# Altium footprint library 方林 封装库.PcbLib: 101 footprints (part 3 of 7)
Each footprint in its own frame and in the unit in brackets; x right, y up, seen from the top. Pads: shape width x height; smd on the part's side, far side on the other; paste and mask are expansions set on the pad; w line width, h text height; cw(c..) or ccw(c..) is an arc to the next point about the centre after c.
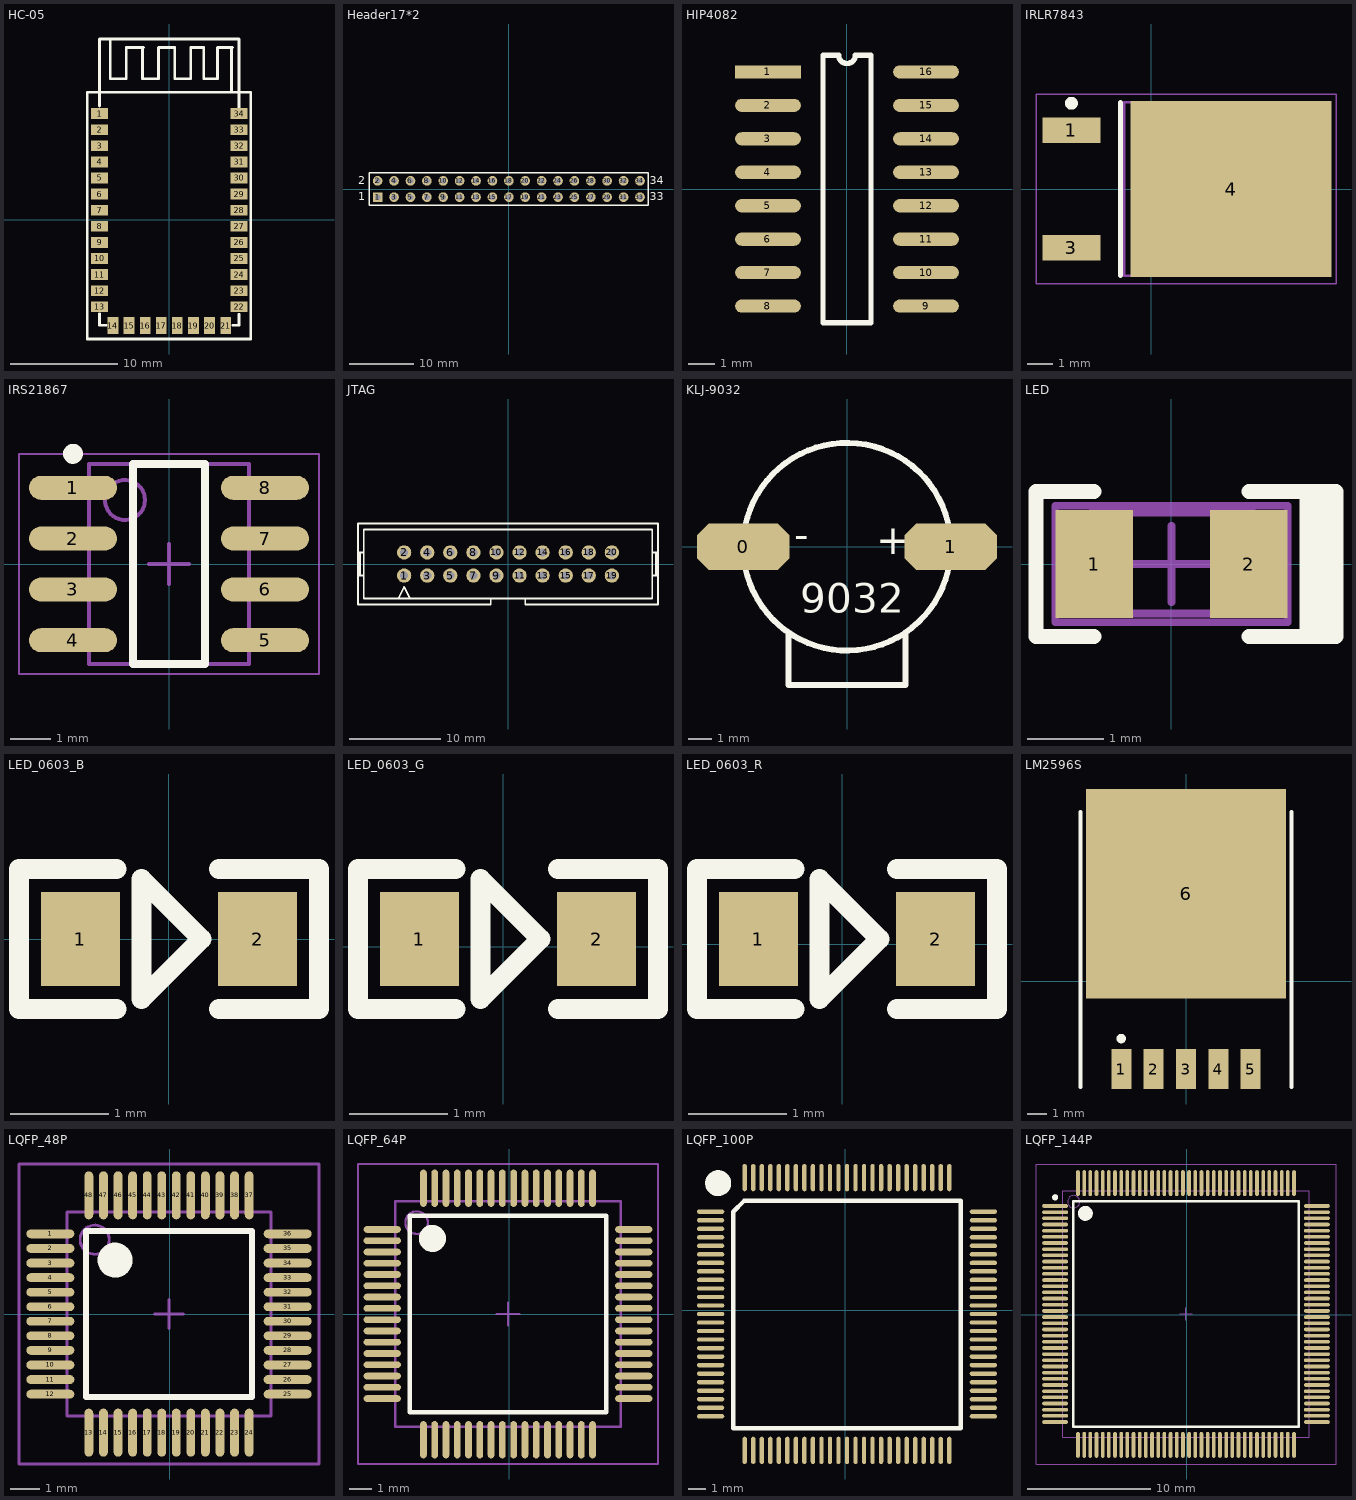
[diagram p2: the footprints below, top view; thin cyan lines are the x and y axes]

## HC-05 [mm]
pads (34):
  rect 1.6x1 smd: 1(-6.5,9.875) 2(-6.5,8.375) 3(-6.5,6.875) 4(-6.5,5.375) 5(-6.5,3.875) 6(-6.5,2.375) 7(-6.5,0.875) 8(-6.5,-0.625) 9(-6.5,-2.125) 10(-6.5,-3.625) 11(-6.5,-5.125) 12(-6.5,-6.625) 13(-6.5,-8.125) 22(6.5,-8.125) 23(6.5,-6.625) 24(6.5,-5.125) 25(6.5,-3.625) 26(6.5,-2.125) 27(6.5,-0.625) 28(6.5,0.875) 29(6.5,2.375) 30(6.5,3.875) 31(6.5,5.375) 32(6.5,6.875) 33(6.5,8.375) 34(6.5,9.875)
  rect 1x1.6 smd: 14(-5.25,-9.875) 15(-3.75,-9.875) 16(-2.25,-9.875) 17(-0.75,-9.875) 18(0.75,-9.875) 19(2.25,-9.875) 20(3.75,-9.875) 21(5.25,-9.875)
Top Overlay:
  lines w0.254: -6.5,-8.775 -6.5,-9.85 -5.875,-9.85 ; -6.5,10.575 -6.5,16.825 6.5,16.825 ; -5.5,16.725 -5.5,13.125 -4,13.125 -4,16.025 -2.4,16.025 -2.5,15.925 -2.5,13.125 -1,13.125 -1,16.025 0.5,16.025 0.5,13.125 2,13.125 2,16.025 3.2,16.025 3.2,13.125 4.5,13.125 4.5,16.025 5.9,16.025 5.8,15.925 5.8,12.025 ; 5.925,-9.85 6.5,-9.85 6.5,-8.825 ; 6.5,10.475 6.5,16.8 ; -7.65,-11.125 -7.65,11.875 -6.325,11.875 6.675,11.875 7.6,11.875 7.6,-11.125 -7.65,-11.125
3D body: height 0.05, standoff 0, extent -6.581,-9.903 6.5,16.767

## Header17*2 [mm]
pads (34):
  rect 1.5x1.5 hole 0.9: 1(-20.32,-1.27)
  round 1.5 hole 0.9: 2(-20.32,1.27) 3(-17.78,-1.27) 4(-17.78,1.27) 5(-15.24,-1.27) 6(-15.24,1.27) 7(-12.7,-1.27) 8(-12.7,1.27) 9(-10.16,-1.27) 10(-10.16,1.27) 11(-7.62,-1.27) 12(-7.62,1.27) 13(-5.08,-1.27) 14(-5.08,1.27) 15(-2.54,-1.27) 16(-2.54,1.27) 17(0,-1.27) 18(0,1.27) 19(2.54,-1.27) 20(2.54,1.27) 21(5.08,-1.27) 22(5.08,1.27) 23(7.62,-1.27) 24(7.62,1.27) 25(10.16,-1.27) 26(10.16,1.27) 27(12.7,-1.27) 28(12.7,1.27) 29(15.24,-1.27) 30(15.24,1.27) 31(17.78,-1.27) 32(17.78,1.27) 33(20.32,-1.27) 34(20.32,1.27)
Top Overlay:
  lines w0.2: -21.59,-2.54 21.59,-2.54 21.59,2.54 -21.59,2.54 -21.59,-2.54
  text "34" at 21.844,0.762 h1.27
  text "33" at 21.844,-1.778 h1.27
  text "1" at -23.368,-1.778 h1.27
  text "2" at -23.368,0.762 h1.27

## HIP4082 [mm]
pads (16):
  rect 2.5x0.5 smd: 1(-3,4.445)
  oval 2.5x0.5 smd: 2(-3,3.175) 3(-3,1.905) 4(-3,0.635) 5(-3,-0.635) 6(-3,-1.905) 7(-3,-3.175) 8(-3,-4.445) 9(3,-4.445) 10(3,-3.175) 11(3,-1.905) 12(3,-0.635) 13(3,0.635) 14(3,1.905) 15(3,3.175) 16(3,4.445)
Top Overlay:
  lines w0.2: -0.915,-5.08 -0.915,5.08 -0.318,5.08 ccw(c0,5.08) 0.318,5.08 0.915,5.08 0.915,-5.08 -0.915,-5.08
3D body: height 0.76, standoff 0, extent -2.121,-4.699 2.07,4.75

## IRLR7843 [mm]
pads (3):
  rect 2.25x1 smd: 1(-3.1,2.28) 3(-3.1,-2.28)
  rect 7.8x6.85 smd: 4(3.1,0)
Top Overlay:
  circle w0.25: c-3.1,3.33 r0.125
  lines w0.2: -1.2,-3.35 -1.2,3.35
Mechanical 13:
  lines w0.1: -1.05,-3.375 -1.05,3.375 5.17,3.375 5.17,-3.375 -1.05,-3.375
Mechanical 15:
  lines w0.05: -4.475,-3.675 -4.475,3.675 7.175,3.675 7.175,-3.675 -4.475,-3.675
  lines w0.1: 0.85,0 1.85,0 ; 1.35,-0.5 1.35,0.5
3D body: height 2.38, standoff 0.46, extent -1.05,-3.375 5.17,3.375

## IRS21867 [mm]
pads (8):
  oval 2.2x0.6 smd: 1(-2.4,1.905) 2(-2.4,0.635) 3(-2.4,-0.635) 4(-2.4,-1.905) 5(2.4,-1.905) 6(2.4,-0.635) 7(2.4,0.635) 8(2.4,1.905)
Top Overlay:
  circle w0.25: c-2.4,2.755 r0.125
  lines w0.2: -0.9,-2.5 0.9,-2.5 0.9,2.5 -0.9,2.5 -0.9,-2.5
Mechanical 13:
  circle w0.1: c-1.1,1.6 r0.5
  lines w0.1: -2,-2.5 2,-2.5 2,2.5 -2,2.5 -2,-2.5
Mechanical 15:
  lines w0.05: -3.75,-2.75 3.75,-2.75 3.75,2.75 -3.75,2.75 -3.75,-2.75
  lines w0.1: -0.5,0 0.5,0 ; 0,-0.5 0,0.5
3D body: height 1, standoff 0.1, extent -2,-2.5 2,2.5

## JTAG [mil]
pads (20):
  round 62 hole 35: 1(-450,-50) 2(-450,50) 3(-350,-50) 4(-350,50) 5(-250,-50) 6(-250,50) 7(-150,-50) 8(-150,50) 9(-50,-50) 10(-50,50) 11(50,-50) 12(50,50) 13(150,-50) 14(150,50) 15(250,-50) 16(250,50) 17(350,-50) 18(350,50) 19(450,-50) 20(450,50)
Top Overlay:
  lines w8: -650,-50 -625,-50 ; -650,50 -625,50 ; -641.67,-50 -641.67,50 ; -475,-150 -450,-100 -425,-150 ; -339.57,-175 -75,-175 -75,-150 ; -325,-175 -650,-175 -650,175 650,175 650,-175 325,-175 75,-175 75,-150 ; 625,-50 650,-50 ; 625,50 650,50 ; 641.67,-50 641.67,50 ; -75,-150 75,-150 ; -75,-150 -625,-150 -625,150 625,150 625,-150 75,-150
3D body: height 200, standoff 0, extent -653,-178 652,175
3D body: height 200, standoff 0, extent -470,30.03 -430,69.98
3D body: height 200, standoff 0, extent -369.99,30.03 -329.99,69.98
3D body: height 200, standoff 0, extent -269.99,31.03 -229.99,70.98
3D body: height 200, standoff 0, extent -169.99,30.03 -129.99,69.98
3D body: height 200, standoff 0, extent -69.99,29.03 -29.99,68.98
3D body: height 200, standoff 0, extent 30.01,29.03 70.01,68.98
3D body: height 200, standoff 0, extent 131.01,30.03 171.01,69.98
3D body: height 200, standoff 0, extent 230.01,30.03 270.01,69.98
3D body: height 200, standoff 0, extent 329.01,31.03 369.01,70.98
3D body: height 200, standoff 0, extent 429.01,30.03 469.01,69.98
3D body: height 200, standoff 0, extent 430.01,-69.97 470.01,-30.02
3D body: height 200, standoff 0, extent 330.01,-69.97 370.01,-30.02
3D body: height 200, standoff 0, extent 230.01,-69.97 270.01,-30.02
3D body: height 200, standoff 0, extent 131.01,-69.97 171.01,-30.02
3D body: height 200, standoff 0, extent 31.01,-68.97 71.01,-29.02
3D body: height 200, standoff 0, extent -69.99,-69.97 -29.99,-30.02
3D body: height 200, standoff 0, extent -169.99,-68.97 -129.99,-29.02
3D body: height 200, standoff 0, extent -268.99,-69.97 -228.99,-30.02
3D body: height 200, standoff 0, extent -369.99,-68.97 -329.99,-29.02
3D body: height 200, standoff 0, extent -468.99,-69.97 -428.99,-30.02
3D body: height 20, standoff 0, extent -650,-177 652,175

## KLJ-9032 [mm]
pads (2):
  oct 4x2 smd: 0(-4.5,0) 1(4.5,0)
Top Overlay:
  circle w0.254: c0,0 r4.5
  lines w0.254: -2.54,-3.81 -2.54,-5.96 ccw(c-2.5,-5.96) -2.5,-6 2.5,-6 ccw(c2.5,-5.96) 2.54,-5.96 2.54,-3.81
  text "+" at 1.27,-0.762 h2.2
  text "-" at -2.286,-0.508 h2.2
  text "9032" at -2.032,-3.302 h2.2
3D body: height 1.02, standoff 0, extent -4.547,-4.52 4.496,4.52
3D body: height 1.02, standoff 0, extent -2.54,-6.02 2.565,-3.81
3D body: height 0.89, standoff 0.38, extent -1.956,-6.096 2.007,-5.791

## LED [mil]
pads (2):
  rect 40x56 smd: 1(-40,0) 2(40,0)
Top Overlay:
  lines w7.87: -40,-37.5 -70,-37.5 -70,37.5 -40,37.5 ; 40,-37.5 70,-37.5 ; 40,37.5 70,37.5 ; 70,-37.5 70,37.5 ; 70,-37.5 85,-37.5 85,37.5 70,37.5
  lines w10: 77,-33 77,31
Mechanical 13:
  lines w3.94: -41.34,-25.59 -41.34,26.57 42.32,26.57 42.32,-25.59 -41.34,-25.59
Mechanical 15:
  lines w3.94: -19.68,0 19.69,0 ; 0,-19.68 0,19.69 ; -60,-30 -60,30 60,30 60,-30 -60,-30
3D body: height 19.68, standoff 0, extent -41.34,-25.59 42.32,25.59

## LED_0603_B [mm]
pads (2):
  rect 0.8x0.95 smd: 1(-0.9,0) 2(0.9,0)
Top Overlay:
  lines w0.203: -0.533,-0.711 -1.524,-0.711 -1.524,0.711 -0.533,0.711 ; 0.508,-0.711 1.524,-0.711 1.524,0.711 0.508,0.711 ; -0.279,-0.61 0.33,0 -0.279,0.61 -0.279,-0.61
3D body "BLUE0603.STEP": height 0.8, standoff 0, extent -0.8,-0.425 0.8,0.375
3D body "BLUE0603.STEP": height 0.8, standoff 0, extent -0.8,-0.394 0.8,0.406

## LED_0603_G [mm]
pads (2):
  rect 0.8x0.95 smd: 1(-0.849,0.076) 2(0.951,0.076)
Top Overlay:
  lines w0.203: -0.483,-0.635 -1.473,-0.635 -1.473,0.787 -0.483,0.787 ; 0.559,-0.635 1.575,-0.635 1.575,0.787 0.559,0.787 ; -0.229,-0.533 0.381,0.076 -0.229,0.686 -0.229,-0.533
3D body "GREEN0603.STEP": height 0.8, standoff 0, extent -0.749,-0.33 0.851,0.47

## LED_0603_R [mm]
pads (2):
  rect 0.8x0.95 smd: 1(-0.849,0.051) 2(0.951,0.051)
Top Overlay:
  lines w0.203: -0.483,-0.66 -1.473,-0.66 -1.473,0.762 -0.483,0.762 ; 0.559,-0.66 1.575,-0.66 1.575,0.762 0.559,0.762 ; -0.229,-0.559 0.381,0.051 -0.229,0.66 -0.229,-0.559
3D body "RED0603.STEP": height 0.8, standoff 0, extent -0.749,-0.343 0.851,0.457

## LM2596S [mm]
pads (6):
  rect 1.05x2.1 smd: 1(-3.4,-4.606) 2(-1.7,-4.606) 3(0,-4.606) 4(1.7,-4.606) 5(3.4,-4.606)
  rect 10.5x11 smd: 6(0,4.606)
Top Overlay:
  circle w0.25: c-3.4,-3.006 r0.125
  lines w0.2: -5.55,-5.556 -5.55,8.894 ; 5.55,-5.556 5.55,8.894
3D body: height 0.6, standoff 0, extent 2.921,-5.08 3.81,-0.889
3D body: height 0.6, standoff 0, extent 1.27,-5.08 2.159,-0.889
3D body: height 0.6, standoff 0, extent -0.508,-5.08 0.381,-0.889
3D body: height 0.6, standoff 0, extent -2.159,-5.08 -1.27,-0.889
3D body: height 0.6, standoff 0, extent -3.81,-5.08 -2.921,-0.889
3D body: height 1, standoff 0, extent -5.334,8.89 5.334,9.906
3D body: height 3, standoff 0, extent -5.334,-0.889 5.334,8.89

## LQFP_48P [mm]
pads (48):
  oval 1.65x0.3 smd: 1(-4.1,2.75) 2(-4.1,2.25) 3(-4.1,1.75) 4(-4.1,1.25) 5(-4.1,0.75) 6(-4.1,0.25) 7(-4.1,-0.25) 8(-4.1,-0.75) 9(-4.1,-1.25) 10(-4.1,-1.75) 11(-4.1,-2.25) 12(-4.1,-2.75) 25(4.05,-2.75) 26(4.05,-2.25) 27(4.05,-1.75) 28(4.05,-1.25) 29(4.05,-0.75) 30(4.05,-0.25) 31(4.05,0.25) 32(4.05,0.75) 33(4.05,1.25) 34(4.05,1.75) 35(4.05,2.25) 36(4.05,2.75)
  oval 0.3x1.65 smd: 13(-2.775,-4.075) 14(-2.275,-4.075) 15(-1.775,-4.075) 16(-1.275,-4.075) 17(-0.775,-4.075) 18(-0.275,-4.075) 19(0.225,-4.075) 20(0.725,-4.075) 21(1.225,-4.075) 22(1.725,-4.075) 23(2.225,-4.075) 24(2.725,-4.075) 37(2.725,4.075) 38(2.225,4.075) 39(1.725,4.075) 40(1.225,4.075) 41(0.725,4.075) 42(0.225,4.075) 43(-0.275,4.075) 44(-0.775,4.075) 45(-1.275,4.075) 46(-1.775,4.075) 47(-2.275,4.075) 48(-2.775,4.075)
Top Overlay:
  circle w0.6: c-1.875,1.85 r0.3
  lines w0.2: -2.875,-2.85 -2.875,2.85 2.825,2.85 2.825,-2.85 -2.875,-2.85
Mechanical 13:
  circle w0.1: c-2.575,2.55 r0.5
  lines w0.1: -3.525,-3.5 -3.525,3.5 3.475,3.5 3.475,-3.5 -3.525,-3.5
Mechanical 15:
  lines w0.1: -0.525,0 0.475,0 ; -0.025,-0.5 -0.025,0.5 ; -5.175,-5.15 -5.175,5.15 5.125,5.15 5.125,-5.15 -5.175,-5.15
3D body "LQFP-48.STEP": height 1.59, standoff -0.01, extent -4.525,-4.5 4.475,4.5

## LQFP_64P [mm]
pads (64):
  oval 1.65x0.3 smd: 1(-5.626,3.75) 2(-5.626,3.25) 3(-5.626,2.75) 4(-5.626,2.25) 5(-5.626,1.75) 6(-5.626,1.25) 7(-5.626,0.75) 8(-5.626,0.25) 9(-5.626,-0.25) 10(-5.626,-0.75) 11(-5.626,-1.25) 12(-5.626,-1.75) 13(-5.626,-2.25) 14(-5.626,-2.75) 15(-5.626,-3.25) 16(-5.626,-3.75) 33(5.524,-3.75) 34(5.524,-3.25) 35(5.524,-2.75) 36(5.524,-2.25) 37(5.524,-1.75) 38(5.524,-1.25) 39(5.524,-0.75) 40(5.524,-0.25) 41(5.524,0.25) 42(5.524,0.75) 43(5.524,1.25) 44(5.524,1.75) 45(5.524,2.25) 46(5.524,2.75) 47(5.524,3.25) 48(5.524,3.75)
  oval 0.3x1.65 smd: 17(-3.801,-5.575) 18(-3.301,-5.575) 19(-2.801,-5.575) 20(-2.301,-5.575) 21(-1.801,-5.575) 22(-1.301,-5.575) 23(-0.801,-5.575) 24(-0.301,-5.575) 25(0.199,-5.575) 26(0.699,-5.575) 27(1.199,-5.575) 28(1.699,-5.575) 29(2.199,-5.575) 30(2.699,-5.575) 31(3.199,-5.575) 32(3.699,-5.575) 49(3.699,5.575) 50(3.199,5.575) 51(2.699,5.575) 52(2.199,5.575) 53(1.699,5.575) 54(1.199,5.575) 55(0.699,5.575) 56(0.199,5.575) 57(-0.301,5.575) 58(-0.801,5.575) 59(-1.301,5.575) 60(-1.801,5.575) 61(-2.301,5.575) 62(-2.801,5.575) 63(-3.301,5.575) 64(-3.801,5.575)
Top Overlay:
  circle w0.6: c-3.401,3.35 r0.3
  lines w0.2: -4.401,-4.35 4.299,-4.35 4.299,4.35 -4.401,4.35 -4.401,-4.35
Mechanical 13:
  circle w0.1: c-4.101,4.05 r0.5
  lines w0.1: -5.051,-5 4.949,-5 4.949,5 -5.051,5 -5.051,-5
Mechanical 15:
  lines w0.1: -0.551,0 0.449,0 ; -0.051,-0.5 -0.051,0.5 ; -6.701,-6.65 6.599,-6.65 6.599,6.65 -6.701,6.65 -6.701,-6.65
3D body "LQFP50P1200X1200X160-64.STEP": height 1.59, standoff -0.01, extent -6.151,-6.1 6.049,6.1

## LQFP_100P [mil]
pads (100):
  oval 62.99x10 smd: 1(-311,227) 2(-311,207.31) 3(-311,187.63) 4(-311,167.94) 5(-311,148.26) 6(-311,128.57) 7(-311,108.89) 8(-311,89.2) 9(-311,69.52) 10(-311,49.83) 11(-311,30.15) 12(-311,10.46) 13(-311,-9.22) 14(-311,-28.91) 15(-311,-48.59) 16(-311,-68.28) 17(-311,-87.96) 18(-311,-107.65) 19(-311,-127.33) 20(-311,-147.02) 21(-311,-166.7) 22(-311,-186.39) 23(-311,-206.07) 24(-311,-225.76) 25(-311,-245.44) 51(318.92,-245.44) 52(318.92,-225.76) 53(318.92,-206.07) 54(318.92,-186.39) 55(318.92,-166.7) 56(318.92,-147.02) 57(318.92,-127.33) 58(318.92,-107.65) 59(318.92,-87.96) 60(318.92,-68.28) 61(318.92,-48.59) 62(318.92,-28.91) 63(318.92,-9.22) 64(318.92,10.46) 65(318.92,30.15) 66(318.92,49.83) 67(318.92,69.52) 68(318.92,89.2) 69(318.92,108.89) 70(318.92,128.57) 71(318.92,148.26) 72(318.92,167.94) 73(318.92,187.63) 74(318.92,207.31) 75(318.92,227)
  oval 10x62.99 smd: 26(-232.26,-324.18) 27(-212.57,-324.18) 28(-192.89,-324.18) 29(-173.2,-324.18) 30(-153.52,-324.18) 31(-133.83,-324.18) 32(-114.15,-324.18) 33(-94.46,-324.18) 34(-74.78,-324.18) 35(-55.09,-324.18) 36(-35.41,-324.18) 37(-15.72,-324.18) 38(3.96,-324.18) 39(23.65,-324.18) 40(43.33,-324.18) 41(63.02,-324.18) 42(82.7,-324.18) 43(102.39,-324.18) 44(122.07,-324.18) 45(141.76,-324.18) 46(161.44,-324.18) 47(181.13,-324.18) 48(200.81,-324.18) 49(220.5,-324.18) 50(240.18,-324.18) 76(240.18,305.74) 77(220.5,305.74) 78(200.81,305.74) 79(181.13,305.74) 80(161.44,305.74) 81(141.76,305.74) 82(122.07,305.74) 83(102.39,305.74) 84(82.7,305.74) 85(63.02,305.74) 86(43.33,305.74) 87(23.65,305.74) 88(3.96,305.74) 89(-15.72,305.74) 90(-35.41,305.74) 91(-55.09,305.74) 92(-74.78,305.74) 93(-94.46,305.74) 94(-114.15,305.74) 95(-133.83,305.74) 96(-153.52,305.74) 97(-173.2,305.74) 98(-192.89,305.74) 99(-212.57,305.74) 100(-232.26,305.74)
Top Overlay:
  circle w30: c-293.69,293 r15
  lines w10: -259,-273 267,-273 267,252 -234,252 -259,227 -259,-273
3D body "lqfp100.stp": height 59.06, standoff 0, extent -311,-324.18 318.92,305.74

## LQFP_144P [mm]
pads (144):
  oval 2.1x0.3 smd: 1(-10.651,8.826) 2(-10.651,8.326) 3(-10.651,7.826) 4(-10.651,7.326) 5(-10.651,6.826) 6(-10.651,6.326) 7(-10.651,5.826) 8(-10.651,5.326) 9(-10.651,4.826) 10(-10.651,4.326) 11(-10.651,3.826) 12(-10.651,3.326) 13(-10.651,2.826) 14(-10.651,2.326) 15(-10.651,1.826) 16(-10.651,1.326) 17(-10.651,0.826) 18(-10.651,0.326) 19(-10.651,-0.174) 20(-10.651,-0.674) 21(-10.651,-1.174) 22(-10.651,-1.674) 23(-10.651,-2.174) 24(-10.651,-2.674) 25(-10.651,-3.174) 26(-10.651,-3.674) 27(-10.651,-4.174) 28(-10.651,-4.674) 29(-10.651,-5.174) 30(-10.651,-5.674) 31(-10.651,-6.174) 32(-10.651,-6.674) 33(-10.651,-7.174) 34(-10.651,-7.674) 35(-10.651,-8.174) 36(-10.651,-8.674) 73(10.549,-8.674) 74(10.549,-8.174) 75(10.549,-7.674) 76(10.549,-7.174) 77(10.549,-6.674) 78(10.549,-6.174) 79(10.549,-5.674) 80(10.549,-5.174) 81(10.549,-4.674) 82(10.549,-4.174) 83(10.549,-3.674) 84(10.549,-3.174) 85(10.549,-2.674) 86(10.549,-2.174) 87(10.549,-1.674) 88(10.549,-1.174) 89(10.549,-0.674) 90(10.549,-0.174) 91(10.549,0.326) 92(10.549,0.826) 93(10.549,1.326) 94(10.549,1.826) 95(10.549,2.326) 96(10.549,2.826) 97(10.549,3.326) 98(10.549,3.826) 99(10.549,4.326) 100(10.549,4.826) 101(10.549,5.326) 102(10.549,5.826) 103(10.549,6.326) 104(10.549,6.826) 105(10.549,7.326) 106(10.549,7.826) 107(10.549,8.326) 108(10.549,8.826)
  oval 0.3x2.1 smd: 37(-8.801,-10.524) 38(-8.301,-10.524) 39(-7.801,-10.524) 40(-7.301,-10.524) 41(-6.801,-10.524) 42(-6.301,-10.524) 43(-5.801,-10.524) 44(-5.301,-10.524) 45(-4.801,-10.524) 46(-4.301,-10.524) 47(-3.801,-10.524) 48(-3.301,-10.524) 49(-2.801,-10.524) 50(-2.301,-10.524) 51(-1.801,-10.524) 52(-1.301,-10.524) 53(-0.801,-10.524) 54(-0.301,-10.524) 55(0.199,-10.524) 56(0.699,-10.524) 57(1.199,-10.524) 58(1.699,-10.524) 59(2.199,-10.524) 60(2.699,-10.524) 61(3.199,-10.524) 62(3.699,-10.524) 63(4.199,-10.524) 64(4.699,-10.524) 65(5.199,-10.524) 66(5.699,-10.524) 67(6.199,-10.524) 68(6.699,-10.524) 69(7.199,-10.524) 70(7.699,-10.524) 71(8.199,-10.524) 72(8.699,-10.524) 109(8.699,10.676) 110(8.199,10.676) 111(7.699,10.676) 112(7.199,10.676) 113(6.699,10.676) 114(6.199,10.676) 115(5.699,10.676) 116(5.199,10.676) 117(4.699,10.676) 118(4.199,10.676) 119(3.699,10.676) 120(3.199,10.676) 121(2.699,10.676) 122(2.199,10.676) 123(1.699,10.676) 124(1.199,10.676) 125(0.699,10.676) 126(0.199,10.676) 127(-0.301,10.676) 128(-0.801,10.676) 129(-1.301,10.676) 130(-1.801,10.676) 131(-2.301,10.676) 132(-2.801,10.676) 133(-3.301,10.676) 134(-3.801,10.676) 135(-4.301,10.676) 136(-4.801,10.676) 137(-5.301,10.676) 138(-5.801,10.676) 139(-6.301,10.676) 140(-6.801,10.676) 141(-7.301,10.676) 142(-7.801,10.676) 143(-8.301,10.676) 144(-8.801,10.676)
Top Overlay:
  circle w0.25: c-10.651,9.526 r0.125
  circle w0.6: c-8.201,8.226 r0.3
  lines w0.2: -9.201,-9.074 -9.201,9.226 9.099,9.226 9.099,-9.074 -9.201,-9.074
Mechanical 13:
  circle w0.1: c-9.151,9.176 r0.5
  lines w0.1: -10.051,-9.924 -10.051,10.076 9.949,10.076 9.949,-9.924 -10.051,-9.924
Mechanical 15:
  lines w0.1: -0.551,0.076 0.449,0.076 ; -0.051,-0.424 -0.051,0.576 ; -12.201,-12.074 -12.201,12.226 12.099,12.226 12.099,-12.074 -12.201,-12.074
3D body: height 1.6, standoff 0, extent -10.051,-9.924 9.949,10.076